# Altium footprint library iv_footprints.PcbLib: 724 footprints (part 1 of 46)
Each footprint in its own frame and in the unit in brackets; x right, y up, seen from the top. Pads: shape width x height; smd on the part's side, far side on the other; paste and mask are expansions set on the pad; w line width, h text height; cw(c..) or ccw(c..) is an arc to the next point about the centre after c.
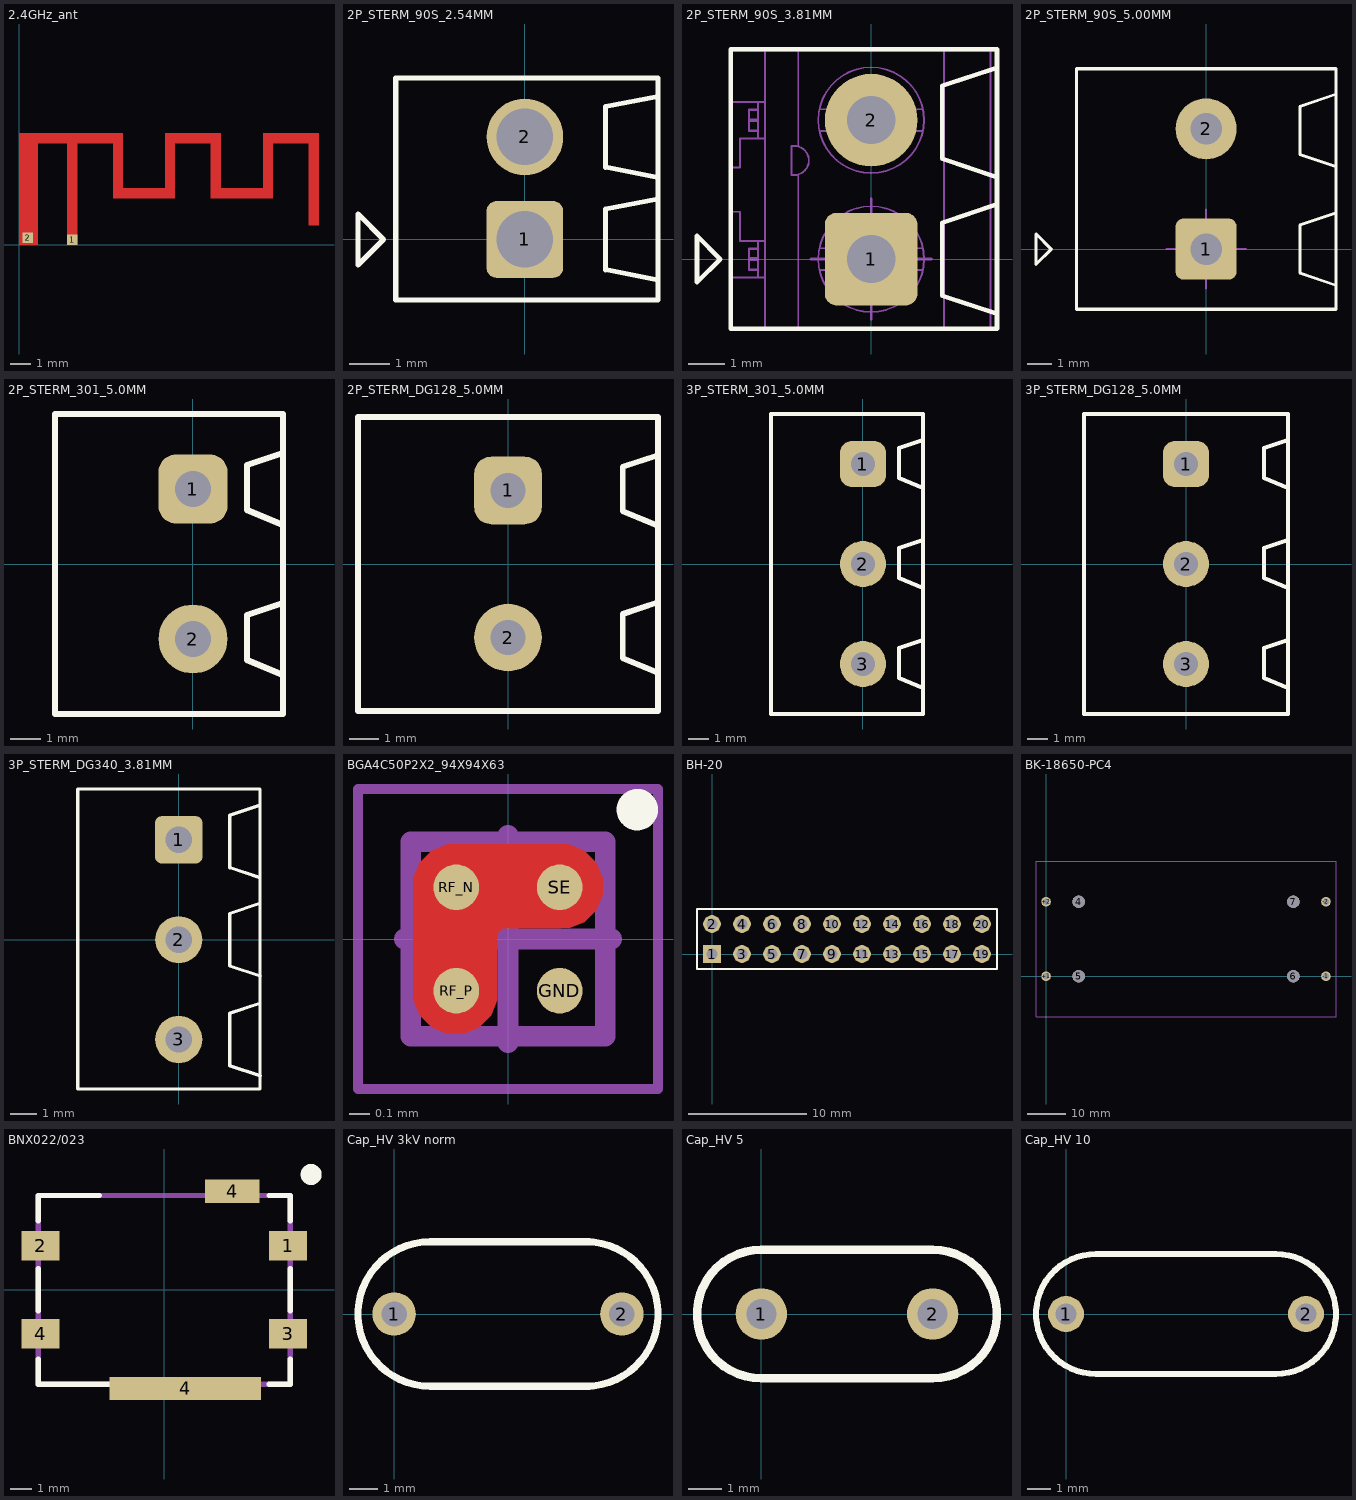
[diagram p0: the footprints below, top view; thin cyan lines are the x and y axes]

## 2.4GHz_ant [mm]
pads (2):
  rect 0.5x0.5 smd paste+0 mask+0: 1(2.55,0.25) 2(0.425,0.35)
Top Layer:
  rectangle: -0.001,4.882 5.001,5.382
  rectangle: 2.301,-0.008 2.801,5.382
  rectangle: 13.901,0.942 14.401,5.382
  rectangle: -0.001,-0.008 0.901,5.382
  rectangle: 7,2.243 7.5,5.382
  rectangle: 11.701,4.882 14.401,5.382
  rectangle: 11.701,2.243 12.199,5.382
  rectangle: 9.199,2.243 12.199,2.743
  rectangle: 4.5,2.243 5.001,5.382
  rectangle: 4.5,2.243 7.5,2.743
  rectangle: 7,4.882 9.7,5.382
  rectangle: 9.199,2.243 9.7,5.382

## 2P_STERM_90S_2.54MM [mm] "TERM BLOCK 2POS SIDE ENT STACKABLE 2.54"
height 8.5
pads (2):
  rrect25% 1.9x1.9 hole 1.4: 1(0,0)
  round 1.9 hole 1.4: 2(0,2.54)
Top Overlay:
  lines w0.127: 3.3,-1 2,-0.75 2,0.75 3.3,1 ; 3.3,1.54 2,1.79 2,3.29 3.3,3.54 ; -4.135,-0.635 -3.5,0 -4.135,0.635 -4.135,-0.635 ; -3.2,-1.5 3.3,-1.5 3.3,4 -3.2,4 -3.2,-1.5
3D body "User Library-connector_PTR_AKZ_692.step": height 8.5, standoff -3.5, extent -3.2,-1.495 3.3,4.045

## 2P_STERM_90S_3.81MM [mil] "TERM BLOCK 2POS SIDE ENT STACKABLE 3.81MM"
height 334.65
pads (2):
  rrect25% 100x100 hole 52: 1(0,0)
  round 100 hole 52: 2(0,150)
Top Overlay:
  lines w5: 135.83,-59.06 76.78,-39.37 76.78,39.37 135.83,59.06 ; 135.83,88.58 76.78,108.27 76.78,187.01 135.83,206.69 ; -188,-25 -163,0 -188,25 -188,-25 ; -151.57,-75 -151.57,226.38 135.83,226.38 135.83,-75 -151.57,-75
Mechanical 13:
  circle w1.97: c0,0 r57.09
  circle w1.97: c0,150 r57.09
  lines w1.97: -151.57,-19.69 -114.76,-19.69 -114.76,19.68 -141.73,19.68 -141.73,51.18 -151.57,51.18 ; -151.57,98.82 -141.73,98.82 -141.73,130.31 -114.76,130.31 -114.76,169.69 -151.57,169.69 ; -131.89,-10.91 -122.05,-10.91 ; -131.89,-1.06 -122.05,-1.06 ; -131.89,1.06 -122.05,1.06 ; -131.89,10.91 -122.05,10.91 ; -131.89,139.09 -122.05,139.09 ; -131.89,148.94 -122.05,148.94 ; -131.89,151.06 -122.05,151.06 ; -131.89,160.91 -122.05,160.91 ; -122.05,-19.69 -122.05,19.68 ; -122.05,-11.81 -131.89,-11.81 -131.89,11.81 -122.05,11.81 ; -122.05,130.31 -122.05,169.69 ; -122.05,138.19 -131.89,138.19 -131.89,161.81 -122.05,161.81 ; -114.56,-75 -114.56,225 ; -78.74,-75 -78.74,91.34 ; -78.74,121.65 -78.74,225 ; -55.85,-11.81 55.85,-11.81 ; -55.85,11.81 55.85,11.81 ; -55.85,138.19 55.85,138.19 ; -55.85,161.81 55.85,161.81 ; 78.74,-75 78.74,225 ; 128.89,-75 128.89,225 ; -151.57,-75 -151.57,225 135.83,225 135.83,-75 -151.57,-75 ; -85.91,90.75 -83.03,90.75 ccw(c-83.03,106.5) -83.03,122.24 -85.91,122.24 -85.91,90.75
Mechanical 15:
  lines w3: -65,0 65,0 ; 0,-65 0,65
3D body "c-1776113-2-o-3d.stp": height 334.65, standoff -137.8, extent -151.57,-75.19 135.83,224.81

## 2P_STERM_90S_5.00MM [mm] "TERM BLOCK 2POS SIDE ENT STACKABLE 5.00MM"
height 13.8
pads (2):
  rrect25% 2.54x2.54 hole 1.3: 1(0,0)
  round 2.54 hole 1.3: 2(0,5)
Top Overlay:
  lines w0.127: 5.396,-1.501 3.896,-1.001 3.896,0.999 5.396,1.499 ; 5.396,3.439 3.896,3.939 3.896,5.939 5.396,6.439 ; -7.075,-0.635 -7.075,0.635 -6.44,0 -7.075,-0.635 ; -5.4,-2.5 5.4,-2.5 5.4,7.5 -5.4,7.5 -5.4,-2.5
Mechanical 15:
  lines w0.076: -1.651,0 1.651,0 ; 0,-1.651 0,1.651

## 2P_STERM_301_5.0MM [mm]
height 10
pads (2):
  rrect50% 2.3x2.3 hole 1.2: 1(0,2.5)
  round 2.3 hole 1.2: 2(0,-2.5)
Top Overlay:
  lines w0.2: 3,-3.7 1.8,-3.2 1.8,-1.7 3,-1.3 ; 3,1.3 1.8,1.8 1.8,3.3 3,3.7 ; -4.6,-5 -4.6,5 3,5 3,-5 -4.6,-5
3D body "Terminal-Screw-3A-2way.STEP": height 10, standoff -3, extent -4.6,-5.6 3,5

## 2P_STERM_DG128_5.0MM [mm]
height 14
pads (2):
  rrect50% 2.3x2.3 hole 1.2: 1(0,2.5)
  round 2.3 hole 1.2: 2(0,-2.5)
Top Overlay:
  lines w0.2: 5.1,-3.7 3.9,-3.2 3.9,-1.7 5.1,-1.3 ; 5.1,1.3 3.9,1.8 3.9,3.3 5.1,3.7 ; -5.1,-5 5.1,-5 5.1,5 -5.1,5 -5.1,-5
3D body "User Library-DG128-5_0-02P-14.step": height 14.3, standoff -3.5, extent -5.105,-5.305 5.095,4.995

## 3P_STERM_301_5.0MM [mm]
height 10
pads (3):
  rrect50% 2.3x2.3 hole 1.2: 1(0,5)
  round 2.3 hole 1.2: 2(0,0) 3(0,-5)
Top Overlay:
  lines w0.2: 3,-6.2 1.8,-5.7 1.8,-4.2 3,-3.8 ; 3,-1.2 1.8,-0.7 1.8,0.8 3,1.2 ; 3,3.8 1.8,4.3 1.8,5.8 3,6.2 ; -4.6,-7.5 -4.6,7.5 3,7.5 3,-7.5 -4.6,-7.5
3D body "Terminal-Screw-3A-2way.STEP": height 10, standoff -3, extent -4.6,-8.1 3,2.5
3D body "Terminal-Screw-3A-2way.STEP": height 10, standoff -3, extent -4.6,-3.1 3,7.5

## 3P_STERM_DG128_5.0MM [mm]
height 14
pads (3):
  rrect50% 2.3x2.3 hole 1.2: 1(0,5)
  round 2.3 hole 1.2: 2(0,0) 3(0,-5)
Top Overlay:
  lines w0.2: 5.1,-6.2 3.9,-5.7 3.9,-4.2 5.1,-3.8 ; 5.1,-1.2 3.9,-0.7 3.9,0.8 5.1,1.2 ; 5.1,3.8 3.9,4.3 3.9,5.8 5.1,6.2 ; -5.1,-7.5 5.1,-7.5 5.1,7.5 -5.1,7.5 -5.1,-7.5
3D body "User Library-DG128-5_0-03P-14.step": height 14.3, standoff -3.5, extent -5.1,-7.8 5.1,7.5

## 3P_STERM_DG340_3.81MM [mm] "TERM BLOCK 3POS SIDE ENT STACKABLE 3.81MM"
height 8.4
pads (3):
  rrect25% 1.8x1.8 hole 1: 1(0,3.81)
  round 1.8 hole 1: 2(0,0) 3(0,-3.81)
Top Overlay:
  lines w0.127: 3.06,2.38 1.95,2.75 1.95,4.75 3.09,5.13 ; 3.075,-2.435 1.95,-2.81 1.95,-4.81 3.105,-5.195 ; 3.075,1.375 1.95,1 1.95,-1 3.105,-1.385 ; -3.85,-5.7 -3.85,5.75 3.1,5.75 3.1,-5.7 -3.85,-5.7
3D body "DG340-3.81-03P-12.STEP": height 8.4, standoff -3.1, extent -3.9,-6.195 3.1,5.715

## BGA4C50P2X2_94X94X63 [mm] "BGA, 4-Leads, Body 0.94x0.94mmx0.63mm, Pitch 0.50mm"
height 0.63
pads (4):
  round 0.22 smd mask+0.1: GND(0.25,-0.25) RF_N(-0.25,0.25) RF_P(-0.25,-0.25) SE(0.25,0.25)
Top Layer:
  pour cut-out: -0.254,-0.457 -0.294,-0.457 -0.369,-0.426 -0.426,-0.369 -0.457,-0.294 -0.457,-0.254 -0.457,0.254 -0.457,0.294 -0.426,0.369 -0.369,0.426 -0.294,0.457 -0.254,0.457 0.254,0.457 0.294,0.457 0.369,0.426 0.426,0.369 0.457,0.294 0.457,0.254 0.457,0.214 0.426,0.139 0.369,0.082 0.294,0.051 0.254,0.051 -0.025,0.051 -0.051,0.025 -0.051,-0.254 -0.051,-0.294 -0.082,-0.369 -0.139,-0.426 -0.214,-0.457
Top Overlay:
  circle w0.1: c0.625,0.625 r0.05
Mechanical 13:
  lines w0.1: -0.47,-0.47 0.47,-0.47 0.47,0.47 -0.47,0.47 -0.47,-0.47
Mechanical 15:
  lines w0.05: -0.725,-0.725 0.725,-0.725 0.725,0.725 -0.725,0.725 -0.725,-0.725
  lines w0.1: -0.5,0 0.5,0 ; 0,-0.5 0,0.5
3D body: height 0.63, standoff 0.3, extent -0.47,-0.47 0.47,0.47

## BH-20 [mm] "Connector; Header; 10x2 Position"
height 9
pads (20):
  rect 1.5x1.5 hole 0.9: 1(0,0)
  round 1.5 hole 0.9: 2(0,2.54) 3(2.54,0) 4(2.54,2.54) 5(5.08,0) 6(5.08,2.54) 7(7.62,0) 8(7.62,2.54) 9(10.16,0) 10(10.16,2.54) 11(12.7,0) 12(12.7,2.54) 13(15.24,0) 14(15.24,2.54) 15(17.78,0) 16(17.78,2.54) 17(20.32,0) 18(20.32,2.54) 19(22.86,0) 20(22.86,2.54)
Top Overlay:
  lines w0.2: -1.27,-1.27 -1.27,3.81 0.635,3.81 24.13,3.81 24.13,-1.27 0.635,-1.27 -1.27,-1.27
3D body "BH-20.step": height 8.75, standoff -3.1, extent -5.08,-3.105 27.94,5.995

## BK-18650-PC4 [mm]
pads (8):
  round 3.2 hole 3.2 unplated: 4(8.44,19.3) 5(8.44,0) 6(64.06,0) 7(64.06,19.3)
  round 2.5 hole 1.6: +1(0,0) +2(0,19.3) -1(72.5,0) -2(72.5,19.3)
Mechanical 15:
  lines w0.254: -2.6,-10.45 -2.6,29.75 75.1,29.75 75.1,-10.45 -2.6,-10.45
3D body "18650_holder.STEP": height 2.79, standoff -21.95, extent -2.6,-10.45 75.1,29.76

## BNX022/023 [mm]
pads (6):
  rect 1.8x1.4 smd: 1(5.9,2.1) 2(-5.9,2.1) 3(5.9,-2.1) 4(-5.9,-2.1)
  rect 7.2x1.1 smd: 4(1,-4.7)
  rect 2.6x1.1 smd: 4(3.25,4.7)
Top Overlay:
  circle w0.5: c7,5.5 r0.25
  lines w0.254: -6,-3.3 -6,-4.5 1.5,-4.5 ; -6,-1 -6,1 ; -6,3.3 -6,4.5 -3.1,4.5 ; 5,-4.5 6,-4.5 6,-3.3 ; 5,4.5 6,4.5 6,3.3 ; 6,-1 6,1
Mechanical 13:
  lines w0.254: -6,-4.5 -6,4.5 6,4.5 6,-4.5 -6,-4.5
3D body "User Library-BNX022.step": height 3.1, standoff 0, extent -6.05,-4.55 6.05,4.55

## Cap_HV 3kV norm [mil]
height 433.07
pads (2):
  round 60 hole 35: 1(0,0) 2(314.96,0)
Top Overlay:
  lines w10: 265,-100 ccw(c265,0) 265,100 ; 270,-100 50,-100 cw(c50,0) 50,100 270,100
3D body "CAP 8 HV.stp": height 472.3, standoff -59.06, extent -43.3,-60.04 358.28,58.07

## Cap_HV 5 [mil]
height 275.59
pads (2):
  round 60 hole 35: 1(0,0) 2(200,0)
Top Overlay:
  lines w10: 0,-75 cw(c0,0) 0,75 200,75 cw(c200,0) 200,-75 0,-75
3D body "Kondensator_5mm.step": height 452.76, standoff -42.01, extent -59.06,-49.61 255.91,49.21

## Cap_HV 10 [mil]
height 275.59
pads (2):
  round 60 hole 35: 1(0,0) 2(400,0)
Top Overlay:
  lines w10: 50,-100 cw(c50,0) 50,100 350,100 cw(c350,0) 350,-100 50,-100